# Altium footprint library base-32-bit.PcbLib: 35 footprints (part 3 of 3)
Each footprint in its own frame and in the unit in brackets; x right, y up, seen from the top. Pads: shape width x height; smd on the part's side, far side on the other; paste and mask are expansions set on the pad; w line width, h text height; cw(c..) or ccw(c..) is an arc to the next point about the centre after c.
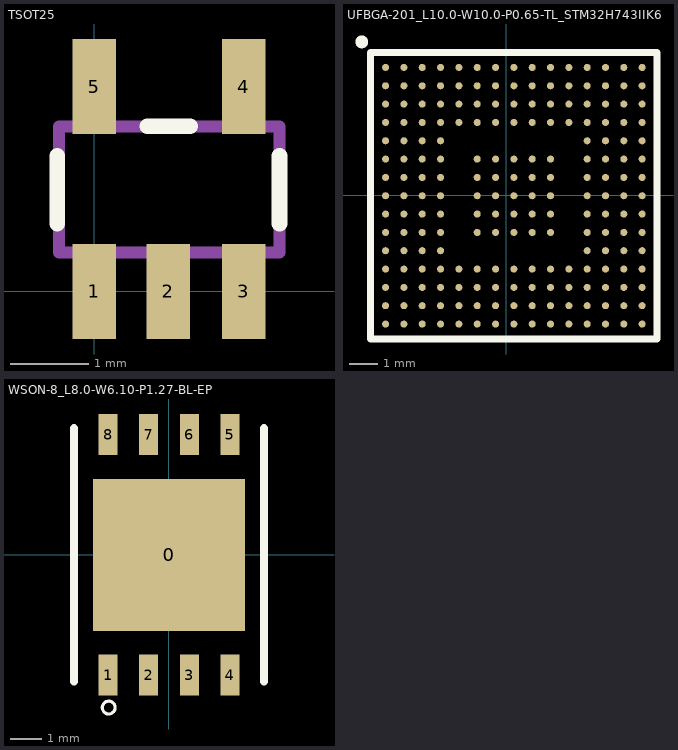
[diagram p2: the footprints below, top view; thin cyan lines are the x and y axes]

## TSOT25 [mil] "TSOT25"
pads (5):
  rect 22x48 smd: 1(0,0) 2(37.4,0) 3(75.4,0) 4(75.4,103.19) 5(0,103.19)
Top Overlay:
  lines w8: -18.6,34.28 -18.6,68.19 ; 26.83,83.19 48.4,83.19 ; 93.4,34.28 93.4,68.19
Mechanical 16:
  rectangle: -9.84,85.18 9.84,111.18
  rectangle: 65.4,85.19 85.4,111.19
  rectangle: 65.4,-7.87 85.4,17.72
  rectangle: 27.56,-7.87 47.4,17.72
  rectangle: -9.84,-7.87 9.84,17.72
  lines w6: -17.72,19.69 -17.72,83.19 93.4,83.19 93.4,19.69 -17.72,19.69
3D body "User Library-tsot-23-5.STEP": height 37.46, standoff -0.92, extent -19.69,0.99 94.49,111.19

## UFBGA-201_L10.0-W10.0-P0.65-TL_STM32H743IIK6 [mm]
pads (201):
  round 0.25 smd: A1(-4.274,4.528) A2(-3.624,4.528) A3(-2.974,4.528) A4(-2.324,4.528) A5(-1.674,4.528) A6(-1.024,4.528) A7(-0.374,4.528) A8(0.276,4.528) A9(0.926,4.528) A10(1.576,4.528) A11(2.226,4.528) A12(2.876,4.528) A13(3.526,4.528) A14(4.176,4.528) A15(4.826,4.528) B1(-4.274,3.878) B2(-3.624,3.878) B3(-2.974,3.878) B4(-2.324,3.878) B5(-1.674,3.878) B6(-1.024,3.878) B7(-0.374,3.878) B8(0.276,3.878) B9(0.926,3.878) B10(1.576,3.878) B11(2.226,3.878) B12(2.876,3.878) B13(3.526,3.878) B14(4.176,3.878) B15(4.826,3.878) C1(-4.274,3.228) C2(-3.624,3.228) C3(-2.974,3.228) C4(-2.324,3.228) C5(-1.674,3.228) C6(-1.024,3.228) C7(-0.374,3.228) C8(0.276,3.228) C9(0.926,3.228) C10(1.576,3.228) C11(2.226,3.228) C12(2.876,3.228) C13(3.526,3.228) C14(4.176,3.228) C15(4.826,3.228) D1(-4.274,2.578) D2(-3.624,2.578) D3(-2.974,2.578) D4(-2.324,2.578) D5(-1.674,2.578) D6(-1.024,2.578) D7(-0.374,2.578) D8(0.276,2.578) D9(0.926,2.578) D10(1.576,2.578) D11(2.226,2.578) D12(2.876,2.578) D13(3.526,2.578) D14(4.176,2.578) D15(4.826,2.578) E1(-4.274,1.928) E2(-3.624,1.928) E3(-2.974,1.928) E4(-2.324,1.928) E12(2.876,1.928) E13(3.526,1.928) E14(4.176,1.928) E15(4.826,1.928) F1(-4.274,1.278) F2(-3.624,1.278) F3(-2.974,1.278) F4(-2.324,1.278) F6(-1.024,1.278) F7(-0.374,1.278) F8(0.276,1.278) F9(0.926,1.278) F10(1.576,1.278) F12(2.876,1.278) F13(3.526,1.278) F14(4.176,1.278) F15(4.826,1.278) G1(-4.274,0.628) G2(-3.624,0.628) G3(-2.974,0.628) G4(-2.324,0.628) G6(-1.024,0.628) G7(-0.374,0.628) G8(0.276,0.628) G9(0.926,0.628) G10(1.576,0.628) G12(2.876,0.628) G13(3.526,0.628) G14(4.176,0.628) G15(4.826,0.628) H1(-4.274,-0.022) H2(-3.624,-0.022) H3(-2.974,-0.022) H4(-2.324,-0.022) H6(-1.024,-0.022) H7(-0.374,-0.022) H8(0.276,-0.022) H9(0.926,-0.022) H10(1.576,-0.022) H12(2.876,-0.022) H13(3.526,-0.022) H14(4.176,-0.022) H15(4.826,-0.022) J1(-4.274,-0.672) J2(-3.624,-0.672) J3(-2.974,-0.672) J4(-2.324,-0.672) J6(-1.024,-0.672) J7(-0.374,-0.672) J8(0.276,-0.672) J9(0.926,-0.672) J10(1.576,-0.672) J12(2.876,-0.672) J13(3.526,-0.672) J14(4.176,-0.672) J15(4.826,-0.672) K1(-4.274,-1.322) K2(-3.624,-1.322) K3(-2.974,-1.322) K4(-2.324,-1.322) K6(-1.024,-1.322) K7(-0.374,-1.322) K8(0.276,-1.322) K9(0.926,-1.322) K10(1.576,-1.322) K12(2.876,-1.322) K13(3.526,-1.322) K14(4.176,-1.322) K15(4.826,-1.322) L1(-4.274,-1.972) L2(-3.624,-1.972) L3(-2.974,-1.972) L4(-2.324,-1.972) L12(2.876,-1.972) L13(3.526,-1.972) L14(4.176,-1.972) L15(4.826,-1.972) M1(-4.274,-2.622) M2(-3.624,-2.622) M3(-2.974,-2.622) M4(-2.324,-2.622) M5(-1.674,-2.622) M6(-1.024,-2.622) M7(-0.374,-2.622) M8(0.276,-2.622) M9(0.926,-2.622) M10(1.576,-2.622) M11(2.226,-2.622) M12(2.876,-2.622) M13(3.526,-2.622) M14(4.176,-2.622) M15(4.826,-2.622) N1(-4.274,-3.272) N2(-3.624,-3.272) N3(-2.974,-3.272) N4(-2.324,-3.272) N5(-1.674,-3.272) N6(-1.024,-3.272) N7(-0.374,-3.272) N8(0.276,-3.272) N9(0.926,-3.272) N10(1.576,-3.272) N11(2.226,-3.272) N12(2.876,-3.272) N13(3.526,-3.272) N14(4.176,-3.272) N15(4.826,-3.272) P1(-4.274,-3.922) P2(-3.624,-3.922) P3(-2.974,-3.922) P4(-2.324,-3.922) P5(-1.674,-3.922) P6(-1.024,-3.922) P7(-0.374,-3.922) P8(0.276,-3.922) P9(0.926,-3.922) P10(1.576,-3.922) P11(2.226,-3.922) P12(2.876,-3.922) P13(3.526,-3.922) P14(4.176,-3.922) P15(4.826,-3.922) R1(-4.274,-4.572) R2(-3.624,-4.572) R3(-2.974,-4.572) R4(-2.324,-4.572) R5(-1.674,-4.572) R6(-1.024,-4.572) R7(-0.374,-4.572) R8(0.276,-4.572) R9(0.926,-4.572) R10(1.576,-4.572) R11(2.226,-4.572) R12(2.876,-4.572) R13(3.526,-4.572) R14(4.176,-4.572) R15(4.826,-4.572)
Top Overlay:
  circle w0.254: c-5.118,5.436 r0.102
  lines w0.254: -4.804,-5.102 5.356,-5.102 5.356,5.058 -4.804,5.058 -4.804,-5.102
3D body "User Library-STM32F746IGT6_UFBGA 176+25.step": height 0.67, standoff -0.08, extent -4.746,-5 5.254,5

## WSON-8_L8.0-W6.10-P1.27-BL-EP [mm]
pads (9):
  rect 4.8x4.8 smd: 0(0,0)
  rect 0.6x1.3 smd: 1(-1.92,-3.8) 2(-0.64,-3.8) 3(0.64,-3.8) 4(1.92,-3.8) 5(1.92,3.8) 6(0.64,3.8) 7(-0.64,3.8) 8(-1.92,3.8)
Top Overlay:
  circle w0.1: c-1.905,-4.826 r0.203
  lines w0.254: -3,-4 -3,4 ; 3,-4 3,4
3D body "User Library-WSON-8_6x8mm.STEP": height 0.81, standoff -0.07, extent -3.003,-3.987 2.997,4.013